# Altium footprint library SI944C.PcbLib: 78 footprints (part 5 of 5)
Each footprint in its own frame and in the unit in brackets; x right, y up, seen from the top. Pads: shape width x height; smd on the part's side, far side on the other; paste and mask are expansions set on the pad; w line width, h text height; cw(c..) or ccw(c..) is an arc to the next point about the centre after c.
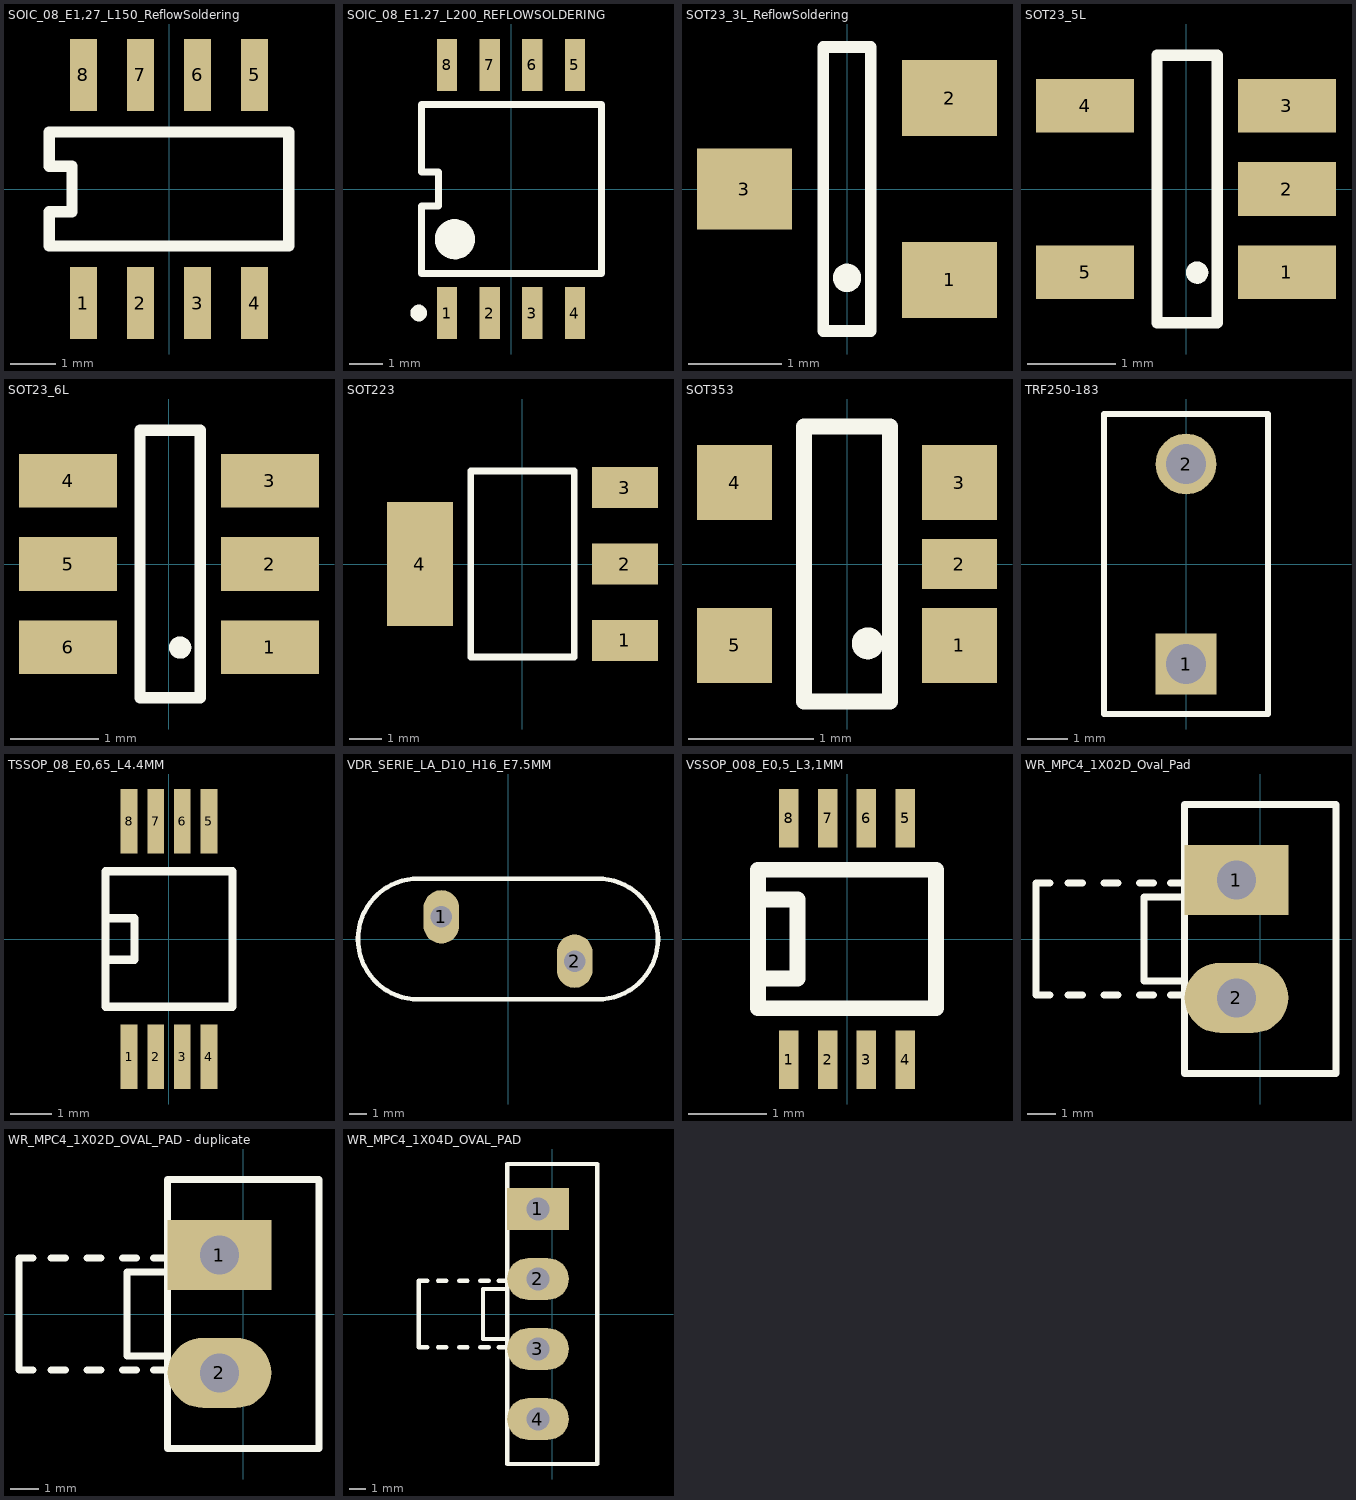
[diagram p4: the footprints below, top view; thin cyan lines are the x and y axes]

## SOIC_08_E1,27_L150_ReflowSoldering [mil]
pads (8):
  rect 24x63 smd paste-3: 1(-75,-100) 2(-25,-100) 3(25,-100) 4(75,-100) 5(75,100) 6(25,100) 7(-25,100) 8(-75,100)
Top Overlay:
  lines w10: -105,-50 -105,-20 -85,-20 -85,20 -105,20 -105,50 105,50 105,-50 -105,-50
3D body "User Library-SOIC-8-150.STEP": height 68.9, standoff 0, extent -98.42,-122.04 98.43,122.05

## SOIC_08_E1.27_L200_REFLOWSOLDERING [mm] "SOIC, 8-Leads, Body 5.28x5.28mm, Pitch 1.27mm, IPC Medium Density"
height 2.16
pads (8):
  rect 0.6x1.55 smd paste-0.051 mask+0.102: 1(-1.905,-3.7) 2(-0.635,-3.7) 3(0.635,-3.7) 4(1.905,-3.7) 5(1.905,3.7) 6(0.635,3.7) 7(-0.635,3.7) 8(-1.905,3.7)
Top Overlay:
  circle w0.25: c-2.755,-3.7 r0.125
  circle w0.6: c-1.673,-1.498 r0.3
  lines w0.203: -2.667,-2.525 2.7,-2.525 2.7,2.525 -2.667,2.525 -2.667,0.508 -2.159,0.508 -2.159,-0.508 -2.667,-0.508 -2.667,-2.525
3D body "User Library-SOIC-8-208.STEP": height 2.17, standoff 0.02, extent -2.7,-4.1 2.7,4.1

## SOT23_3L_ReflowSoldering [mil]
pads (3):
  rect 40x32 smd paste-3: 1(43.31,-38.39) 2(43.31,38.39)
  rect 40x34 smd paste-3: 3(-43.31,0)
Top Overlay:
  circle w7: c0,-37.5 r2.5
  lines w5: -10,-60 10,-60 10,60 -10,60 -10,-60
3D body "SW3dPS-transistor SOT233.STEP": height 40.89, standoff -2.41, extent -55.12,-57.09 55.12,57.09

## SOT23_5L [mil]
pads (5):
  rect 44x24 smd paste-3: 1(45.28,-37.4) 2(45.28,0) 3(45.28,37.4) 4(-45.28,37.4) 5(-45.28,-37.4)
Top Overlay:
  circle w5: c5,-37.5 r2.5
  lines w5: -13,-60 -13,60 14,60 14,-60 -13,-60
3D body "User Library-SOT23-5-1.STEP": height 51.18, standoff 0, extent -59.06,-59.06 59.05,59.05

## SOT23_6L [mil]
pads (6):
  rect 44x24 smd paste-3: 1(45.28,-37.4) 2(45.3,0) 3(45.28,37.4) 4(-45.28,37.4) 5(-45.28,0) 6(-45.28,-37.4)
Top Overlay:
  circle w5: c5,-37.5 r2.5
  lines w5: -13,-60 14,-60 14,60 -13,60 -13,-60
3D body "User Library-SOT23-6.STEP": height 51.18, standoff 0, extent -59.06,-59.06 59.05,59.05

## SOT223 [mil]
pads (4):
  rect 80x50 smd paste-3: 1(124,-92.52) 2(124,0) 3(124,92.52)
  rect 80x150 smd paste-3: 4(-124,0)
Top Overlay:
  lines w8: -62.5,-112.5 -62.5,112.5 62.5,112.5 62.5,-112.5 -62.5,-112.5
3D body "SW3dPS-SOT-223-1.STEP": height 64.57, standoff -0.39, extent -132.28,-127.95 143.31,127.95

## SOT353 [mm]
pads (5):
  rect 0.6x0.6 smd paste-0.051: 1(0.899,-0.65) 3(0.899,0.65) 4(-0.9,0.65) 5(-0.9,-0.65)
  rect 0.6x0.4 smd paste-0.051: 2(0.899,0)
Top Overlay:
  circle w0.127: c0.165,-0.635 r0.064
  lines w0.127: -0.343,-1.1 0.343,-1.1 0.343,1.1 -0.343,1.1 -0.343,-1.1
3D body "User Library-sot353.STEP": height 1, standoff 0, extent -1.143,-1.084 1.157,1.016

## TRF250-183 [mil] "TRF250-183"
height 413.39
pads (2):
  rect 60x60 hole 39.37 mask+2.52: 1(0,-98.43)
  round 60 hole 39.37 mask+2.52: 2(0,98.43)
Top Overlay:
  lines w6: -80.71,-147.64 80.71,-147.64 80.71,147.64 -80.71,147.64 -80.71,-147.64

## TSSOP_08_E0,65_L4.4MM [mil]
height 47.24
pads (8):
  rect 16x62 smd paste-2 mask+5: 1(-38.39,-113.19) 2(-12.8,-113.19) 3(12.8,-113.19) 4(38.39,-113.19) 5(38.39,113.19) 6(12.8,113.19) 7(-12.8,113.19) 8(-38.39,113.19)
Top Overlay:
  lines w8: -61.02,-20 -33.23,-20 -33.23,20 -58.23,20 ; -61.02,-65 -61.02,65 61.02,65 61.02,-65 -61.02,-65
3D body "SW3dPS-TSS0P8.STEP": height 43, standoff 0, extent -55.61,-123.62 62.5,123.62

## VDR_SERIE_LA_D10_H16_E7.5MM [mm]
pads (2):
  rrect100% 2x3 hole 1.2: 1(-3.75,1.25) 2(3.75,-1.25)
Top Overlay:
  lines w0.254: -5.042,-3.4 cw(c-5.042,0) -5.042,3.4 ; -5,-3.4 5,-3.4 ; -5,3.4 5,3.4 ; 5.042,-3.4 ccw(c5.042,0) 5.042,3.4
3D body "WE-VD_14_mm.stp": height 15.98, standoff -17.85, extent -8.193,-15.42 8.234,18.412

## VSSOP_008_E0,5_L3,1MM [mm]
pads (8):
  rect 0.25x0.75 smd paste-0.025 mask+0.127: 1(-0.75,-1.55) 2(-0.25,-1.55) 3(0.25,-1.55) 4(0.75,-1.55) 5(0.75,1.55) 6(0.25,1.55) 7(-0.25,1.55) 8(-0.75,1.55)
Top Overlay:
  lines w0.203: -1.143,-0.508 -0.635,-0.508 -0.635,0.508 -1.143,0.508 ; -1.143,-0.889 1.143,-0.889 1.143,0.889 -1.143,0.889 -1.143,-0.889
3D body: height 0.84, standoff 0.76, extent -0.898,-0.799 -0.5,-0.4
3D body "SW3dPS-VSSOP8.STEP": height 0.82, standoff -0.03, extent -1.15,-1.552 1.15,1.55

## WR_MPC4_1X02D_Oval_Pad [mm]
height 12.8
pads (2):
  rect 3.7x2.5 hole 1.4: 1(-0.85,2.1)
  rrect100% 3.7x2.5 hole 1.4: 2(-0.85,-2.1)
Top Overlay:
  lines w0.254: -7.5,-2 -8,-2 -8,2 -7.5,2 ; -6.85,-2 -6.35,-2 ; -6.85,2 -6.35,2 ; -5.58,-2 -5.08,-2 ; -5.58,2 -5.08,2 ; -4.31,-2 -3.81,-2 ; -4.31,2 -3.81,2 ; -3.2,-2 -2.7,-2 ; -3.2,2 -2.7,2 ; -2.7,-1.5 -4.15,-1.5 -4.15,1.5 -2.7,1.5 ; -2.7,-4.8 -2.7,4.8 2.7,4.8 2.7,-4.8 -2.7,-4.8
3D body "64900211122.stp": height 12.82, standoff -3.48, extent -4.327,-4.8 2.573,4.8

## WR_MPC4_1X02D_OVAL_PAD - duplicate [mm]
pads (2):
  rect 3.7x2.5 hole 1.4: 1(-0.85,2.1)
  rrect100% 3.7x2.5 hole 1.4: 2(-0.85,-2.1)
Top Overlay:
  lines w0.254: -7.5,-2 -8,-2 -8,2 -7.5,2 ; -6.85,-2 -6.35,-2 ; -6.85,2 -6.35,2 ; -5.58,-2 -5.08,-2 ; -5.58,2 -5.08,2 ; -4.31,-2 -3.81,-2 ; -4.31,2 -3.81,2 ; -3.2,-2 -2.7,-2 ; -3.2,2 -2.7,2 ; -2.7,-1.5 -4.15,-1.5 -4.15,1.5 -2.7,1.5 ; -2.7,-4.8 2.7,-4.8 2.7,4.8 -2.7,4.8 -2.7,-4.8
3D body "64900211122.stp": height 12.82, standoff -3.48, extent -4.327,-4.8 2.573,4.8

## WR_MPC4_1X04D_OVAL_PAD [mm]
pads (4):
  rect 3.7x2.5 hole 1.4: 1(-0.85,6.3)
  rrect100% 3.7x2.5 hole 1.4: 2(-0.85,2.1)
  oval 3.7x2.5 hole 1.4: 3(-0.85,-2.1) 4(-0.85,-6.3)
Top Overlay:
  lines w0.254: -7.5,-2 -8,-2 -8,2 -7.5,2 ; -6.85,-2 -6.35,-2 ; -6.85,2 -6.35,2 ; -5.58,-2 -5.08,-2 ; -5.58,2 -5.08,2 ; -4.31,-2 -3.81,-2 ; -4.31,2 -3.81,2 ; -3.2,-2 -2.7,-2 ; -3.2,2 -2.7,2 ; -2.7,-1.5 -4.15,-1.5 -4.15,1.5 -2.7,1.5 ; -2.7,-9 2.7,-9 2.7,9 -2.7,9 -2.7,-9
3D body "64900411122.stp": height 12.82, standoff -3.48, extent -4.39,-9 2.509,9